# Altium footprint library Res.PcbLib: 49 footprints (part 3 of 4)
Each footprint in its own frame and in the unit in brackets; x right, y up, seen from the top. Pads: shape width x height; smd on the part's side, far side on the other; paste and mask are expansions set on the pad; w line width, h text height; cw(c..) or ccw(c..) is an arc to the next point about the centre after c.
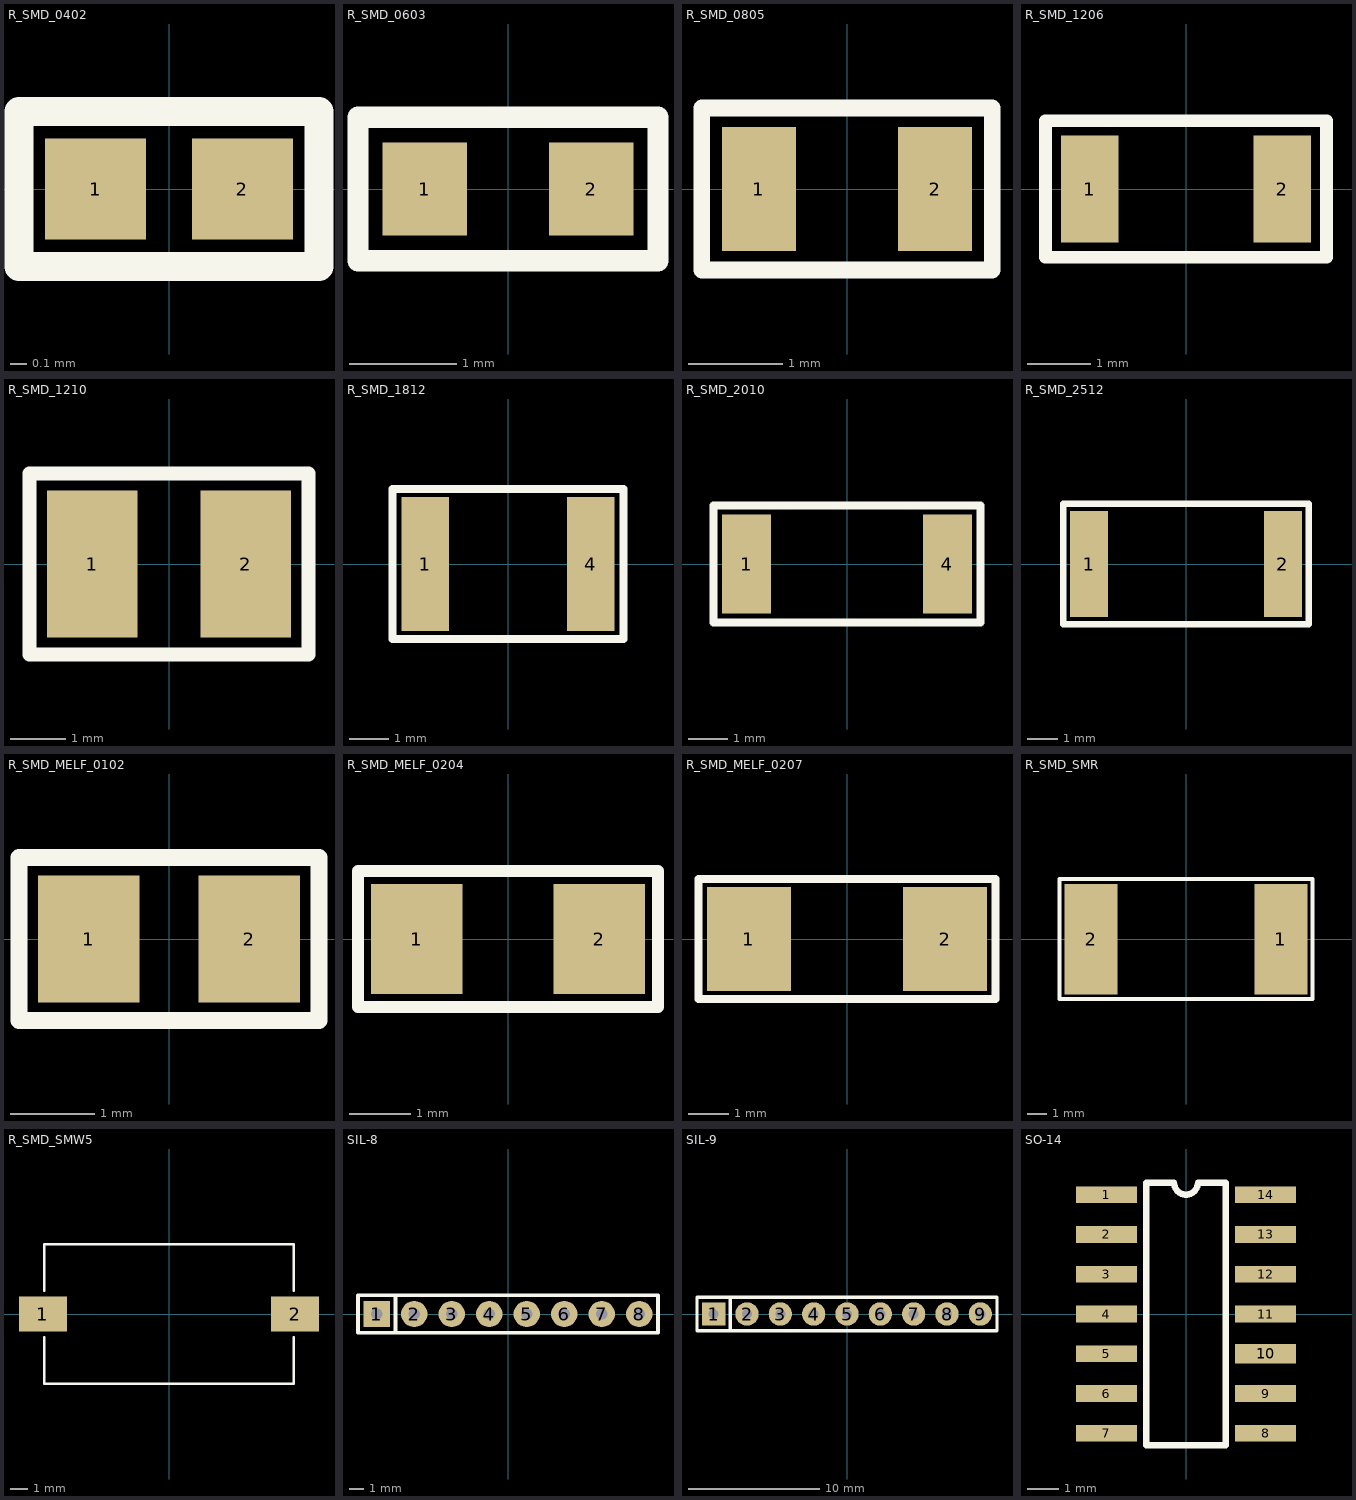
[diagram p2: the footprints below, top view; thin cyan lines are the x and y axes]

## R_SMD_0402 [mm] "Metric Size - 1005"
pads (2):
  rect 0.62x0.62 smd mask+0.051: 1(-0.45,0) 2(0.45,0)
Top Overlay:
  lines w0.178: -0.921,-0.476 -0.921,0.476 0.921,0.476 0.921,-0.476 -0.921,-0.476
3D body "Res_SMD_0402.SLDPRT": height 0.35, standoff 0, extent -0.5,-0.25 0.5,0.25

## R_SMD_0603 [mil] "Metric Size - 1608"
pads (2):
  rect 31x34 smd: 1(-30.5,0) 2(30.5,0)
Top Overlay:
  lines w7.87: -55,-26.25 55,-26.25 55,26.25 -55,26.25 -55,-26.25
3D body "Res_SMD_0603.SLDPRT": height 17.72, standoff 0, extent -31.5,-15.75 31.49,15.75

## R_SMD_0805 [mil] "Metric Size - 2012"
height 39.37
pads (2):
  rect 31x52 smd: 1(-37,0) 2(37,0)
Top Overlay:
  lines w7: -61,-34 61,-34 61,34 -61,34 -61,-34
3D body "Res_SMD_0805.SLDPRT": height 17.72, standoff 0, extent -39.36,-24.6 39.38,24.61

## R_SMD_1206 [mil] "Metric Size - 3216"
height 39.37
pads (2):
  rect 36x67 smd: 1(-60,0) 2(60,0)
Top Overlay:
  lines w8: -87.5,-42.5 87.5,-42.5 87.5,42.5 85,42.5 -87.5,42.5 -87.5,-42.5
3D body "Res_SMD_1206.SLDPRT": height 22.05, standoff 0, extent -62.99,-31.49 63,31.5

## R_SMD_1210 [mil] "Metric Size - 3225"
height 39.37
pads (2):
  rect 65x105 smd: 1(-55,0) 2(55,0)
Top Overlay:
  lines w10: -100,-65 100,-65 100,65 -100,65 -100,-65
3D body "Res_SMD_1210.SLDPRT": height 22.05, standoff 0, extent -62.98,-49.2 63,49.22

## R_SMD_1812 [mm] "Metric Size - 4532"
height 2
pads (2):
  rect 1.2x3.4 smd: 1(-2.1,0) 4(2.1,0)
Top Overlay:
  lines w0.203: -2.921,-1.905 -2.921,1.905 2.921,1.905 2.921,-1.905 -2.921,-1.905
3D body "Res_SMD_1812.SLDPRT": height 0.55, standoff 0, extent -2.25,-1.6 2.25,1.6

## R_SMD_2010 [mm] "Metric Size 5025"
pads (2):
  rect 1.245x2.54 smd: 1(-2.578,0) 4(2.578,0)
Top Overlay:
  lines w0.203: -3.429,-1.499 3.429,-1.499 3.429,1.499 -3.429,1.499 -3.429,-1.499
3D body "Res_SMD_2010.SLDPRT": height 0.56, standoff 0, extent -2.5,-1.25 2.5,1.25

## R_SMD_2512 [mm] "Metric Size 6432"
pads (2):
  rect 1.245x3.5 smd: 1(-3.188,0) 2(3.188,0)
Top Overlay:
  lines w0.203: -4.039,-1.981 -4.039,1.981 4.039,1.981 4.039,-1.981 -4.039,-1.981
3D body "Res_SMD_2512.SLDPRT": height 0.6, standoff 0, extent -3.15,-1.6 3.15,1.6

## R_SMD_MELF_0102 [mm] "Micro MELF; D=1mm; L=2mm (MMU)"
height 1.1
pads (2):
  rect 1.2x1.5 smd: 1(-0.95,0) 2(0.95,0)
Top Overlay:
  lines w0.203: -1.778,-0.965 1.778,-0.965 1.778,0.965 -1.778,0.965 -1.778,-0.965
3D body "Res_SMD_MMU.SLDPRT": height 1.1, standoff 0, extent -1.1,-0.549 1.1,0.549

## R_SMD_MELF_0204 [mm] "mini MELF - D=2mm; L=4mm (MMA)"
height 1.4
pads (2):
  rect 1.5x1.8 smd: 1(-1.5,0) 2(1.5,0)
Top Overlay:
  lines w0.203: -2.464,-1.118 2.464,-1.118 2.464,1.118 -2.464,1.118 -2.464,-1.118
3D body "Res_SMD_MMA.SLDPRT": height 1.4, standoff 0, extent -1.8,-0.699 1.8,0.699

## R_SMD_MELF_0207 [mm] "MELF - D=2mm; L=7mm (MMB)"
height 2.2
pads (2):
  rect 2.1x2.6 smd: 1(-2.45,0) 2(2.45,0)
Top Overlay:
  lines w0.203: -3.708,-1.499 -3.708,1.499 3.708,1.499 3.708,-1.499 -3.708,-1.499
3D body "Res_SMD_MMB.SLDPRT": height 2.2, standoff 0, extent -2.9,-1.1 2.9,1.1

## R_SMD_SMR [mm] "Rezystor SMD serii SMR - R100; 1%; 3W"
height 3.81
pads (2):
  rect 2.8x5.8 smd: 1(5,0) 2(-5,0)
Top Overlay:
  lines w0.203: -6.655,-3.15 6.655,-3.15 6.655,3.175 -6.655,3.175 -6.655,-3.15
3D body "SMR_R1`00_1%.STEP": height 3.4, standoff 0, extent -6,-3 6,3

## R_SMD_SMW5 [mil] "SMD Wirewund Power Resistor (5W)"
height 275.59
pads (2):
  rect 106x77 smd paste+0 mask+0: 1(-279.65,0) 2(279.65,0)
Top Overlay:
  lines w6: -276.5,-51.6 -276.5,-154.5 276.5,-154.5 276.5,-51.6 ; -276.5,51.6 -276.5,154.5 276.5,154.5 276.5,51.6
3D body "SMW5.STEP": height 267.43, standoff -0.3, extent -268.1,-143.69 268.12,143.71

## SIL-8 [mil] "Obudowa pionowa"
height 300
pads (8):
  rect 70x70 hole 30: 1(-350,0)
  round 70 hole 30: 2(-250,0) 3(-150,0) 4(-50,0) 5(50,0) 6(150,0) 7(250,0) 8(350,0)
Top Overlay:
  lines w10: -300,-50 -300,50 ; -400,-50 400,-50 400,50 -400,50 -400,-50
3D body "R_PACK_8.STEP": height 386.75, standoff -93.31, extent -399.01,-50 399.02,48.03

## SIL-9 [mil] "Obudowa 1-rzêdowa pionowa"
height 300
pads (9):
  rect 70x70 hole 30: 1(-400,0)
  round 70 hole 30: 2(-300,0) 3(-200,0) 4(-100,0) 5(0,0) 6(100,0) 7(200,0) 8(300,0) 9(400,0)
Top Overlay:
  lines w10: -350,-50 -350,50 ; -450,-50 450,-50 450,50 -450,50 -450,-50
3D body "R_PACK_9.STEP": height 236.75, standoff -93.31, extent -449.01,-50 449.02,48.03

## SO-14 [mil] "Small Outline IC 14pin"
height 60
pads (14):
  rect 77x21 smd: 1(-100,150) 2(-100,100) 3(-100,50) 4(-100,0) 5(-100,-50) 6(-100,-100) 7(-100,-150) 8(100,-150) 9(100,-100) 11(100,0) 12(100,50) 13(100,100) 14(100,150)
  rect 77x24 smd: 10(100,-50)
Top Overlay:
  lines w8: -50,-165 50,-165 50,165 15,165 cw(c0,165) -15,165 -50,165 -50,-165
3D body "so14p865x390ll600ls127h155.stp": height 61.02, standoff 0, extent -118.11,-170.55 118.11,170